# Altium footprint library ADNB95C.PcbLib: 249 footprints (part 15 of 16)
Each footprint in its own frame and in the unit in brackets; x right, y up, seen from the top. Pads: shape width x height; smd on the part's side, far side on the other; paste and mask are expansions set on the pad; w line width, h text height; cw(c..) or ccw(c..) is an arc to the next point about the centre after c.
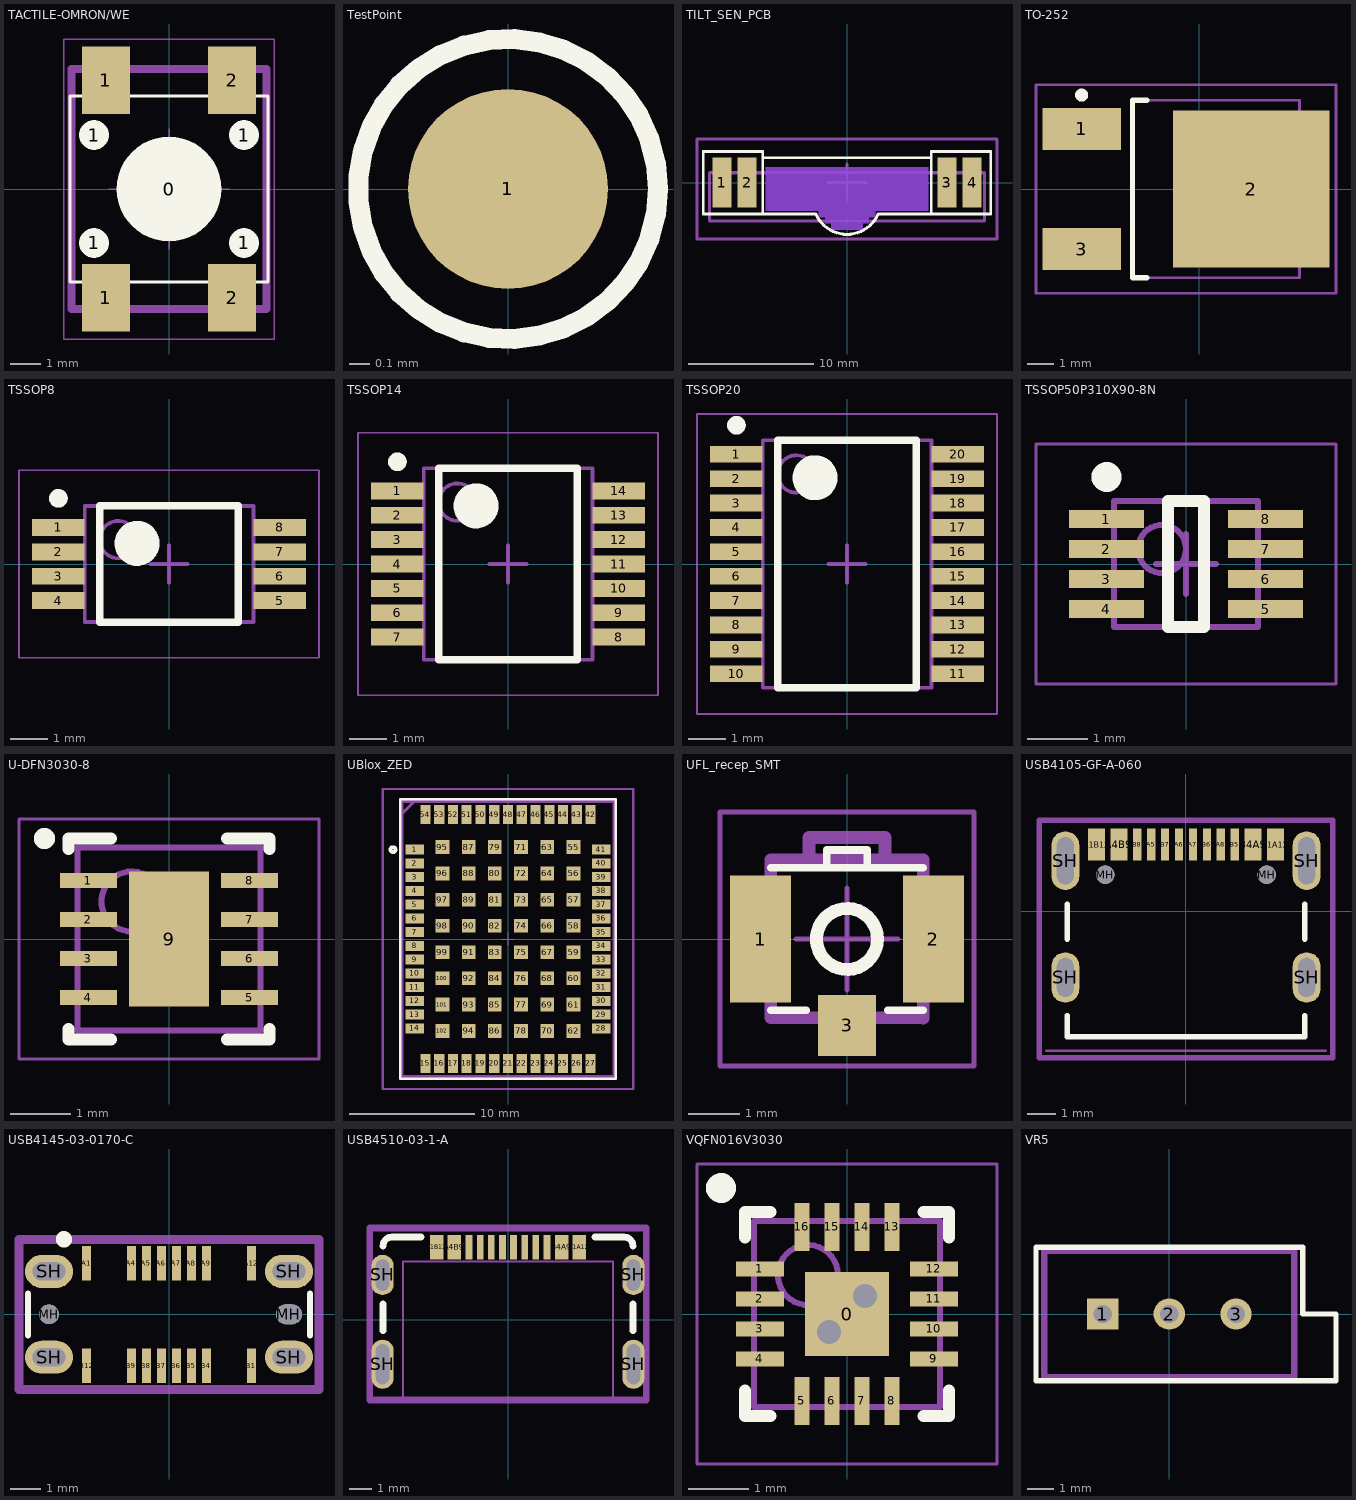
[diagram p14: the footprints below, top view; thin cyan lines are the x and y axes]

## TACTILE-OMRON/WE [mm] "TACTILE, 6 x 6mm-OMRON/Wurth Electronics"
height 4.3
pads (9):
  round 3.5 on Top Overlay: 0(0,0)
  round 1 on Top Overlay: 1(-2.5,-1.8) 1(-2.5,1.8) 1(2.5,-1.8) 1(2.5,1.8)
  rect 1.6x2.25 smd: 1(-2.1,-3.625) 1(-2.1,3.625) 2(2.1,-3.625) 2(2.1,3.625)
Top Overlay:
  lines w0.1: -3.3,-3.1 -3.3,3.1 3.3,3.1 3.3,-3.1 -3.3,-3.1
Top Designator (Mech7):
  text ".Designator" at -7.618,-0.508 h1.52
Top Assembly:
  lines w0.254: -3.25,-4 3.25,-4 3.25,4 -3.25,4 -3.25,-4
Top Courtyard:
  lines w0.05: -2,0 2,0 ; 0,-2 0,2 ; -3.5,-5 3.5,-5 3.5,5 -3.5,5 -3.5,-5
3D body "User Library-TS-1143S-WP.STEP": height 4.3, standoff 0, extent -3.25,-4 3.25,4

## TestPoint [mm]
height 2.5
pads (1):
  round 1 smd paste-10: 1(0,0)
Top Overlay:
  circle w0.1: c0,0 r0.75
Top Designator (Mech7):
  text ".Designator" at -3.809,-0.254 h0.76

## TILT_SEN_PCB [mm]
pads (4):
  rect 1.524x4 smd: 1(-10,0) 2(-8,0) 3(8,0) 4(10,0)
Top Layer keep-out:
  region: -6.5,1.25 6.5,1.25 6.5,-2.25 5.5,-2.25 2.25,-2.25 2.25,-2.75 1.75,-2.75 1.75,-3.25 1.25,-3.25 1.25,-3.75 -1.25,-3.75 -1.25,-3.25 -1.75,-3.25 -1.75,-2.75 -2.25,-2.75 -2.25,-2.25 -6.5,-2.25
Bottom Layer keep-out:
  region: 6.5,1.25 -6.5,1.25 -6.5,-2.25 -5.5,-2.25 -2.25,-2.25 -2.25,-2.75 -1.75,-2.75 -1.75,-3.25 -1.25,-3.25 -1.25,-3.75 1.25,-3.75 1.25,-3.25 1.75,-3.25 1.75,-2.75 2.25,-2.75 2.25,-2.25 5.5,-2.25 6.5,-2.25
Top Overlay:
  lines w0.203: -6.75,-2.5 -6.75,2.5 -11.5,2.5 -11.5,-2.5 -2.5,-2.5 ; -6.75,2 6.75,2 ; 2.5,-2.5 11.5,-2.5 11.5,2.5 6.75,2.5 6.75,-2.5
  lines w0.254: -2.5,-2.5 ccw(c0,-1.4) 2.5,-2.5
Keep-Out Layer:
  lines w0.254: -1.915,-1.977 ccw(c0,-1.4) 1.908,-2 5.5,-2 6.25,-1.5 6.25,1 -6.25,1 -6.25,-1.5 -5.5,-2 -1.908,-2
Top Designator (Mech7):
  text ".Designator" at -7.618,-0.508 h1.52
Top Assembly:
  lines w0.254: -11,-3.051 -11,0.8 11,0.8 11,-3.051 -11,-3.051
Top Courtyard:
  lines w0.254: -1.5,0 1.5,0 ; 0,-1.5 0,1.5 ; -12,-4.5 -12,3.5 12,3.5 12,-4.5 -12,-4.5
3D body "Tilt_Sensor.step": height 10.01, standoff -3.99, extent -11,-3.051 11,0.8

## TO-252 [mm] "D-PAK, 3-Pads, Body 6.4x6.8mm (max), IPC Medium Density"
height 2.3
pads (3):
  rect 3x1.6 smd: 1(-4.5,2.3) 3(-4.5,-2.3)
  rect 6x6 smd: 2(2,0)
Top Overlay:
  circle w0.25: c-4.5,3.6 r0.125
  lines w0.2: -2,-3.4 -2.55,-3.4 -2.55,3.4 -2,3.4
Top Designator (Mech7):
  text ".Designator" at -7.618,-0.508 h1.52
Top Assembly:
  lines w0.1: -2.55,-3.4 -2.55,3.4 3.85,3.4 3.85,-3.4 -2.55,-3.4
Top Courtyard:
  lines w0.1: -0.5,0 0.5,0 ; 0,-0.5 0,0.5 ; -6.25,-4 -6.25,4 5.25,4 5.25,-4 -6.25,-4
3D body "User Library-DPAK_TO-252AA.STEP": height 2.42, standoff 0.02, extent -5.528,-3.367 4.572,3.367

## TSSOP8 [mm] "TSSOP, 8-Leads, Body 3.00x4.40mm, Pitch 0.65mm, IPC Medium Density"
height 1.2
pads (8):
  rect 1.4x0.45 smd: 1(-2.95,0.975) 2(-2.95,0.325) 3(-2.95,-0.325) 4(-2.95,-0.975) 5(2.95,-0.975) 6(2.95,-0.325) 7(2.95,0.325) 8(2.95,0.975)
Top Overlay:
  circle w0.6: c-0.85,0.55 r0.3
  circle w0.25: c-2.95,1.75 r0.125
  lines w0.2: -1.85,-1.55 1.85,-1.55 1.85,1.55 -1.85,1.55 -1.85,-1.55
Top Designator (Mech7):
  text ".Designator" at -3.809,-0.166 h0.76
Top Assembly:
  circle w0.1: c-1.35,0.65 r0.5
  lines w0.1: -2.25,-1.55 2.25,-1.55 2.25,1.55 -2.25,1.55 -2.25,-1.55
Top Courtyard:
  lines w0.05: -4,-2.5 4,-2.5 4,2.5 -4,2.5 -4,-2.5
  lines w0.1: -0.5,0 0.5,0 ; 0,-0.5 0,0.5
3D body "TSSOP8.step": height 1.2, standoff 0, extent -3.2,-1.55 3.2,1.55

## TSSOP14 [mm]
height 1.2
pads (14):
  rect 1.4x0.45 smd: 1(-2.95,1.95) 2(-2.95,1.3) 3(-2.95,0.65) 4(-2.95,0) 5(-2.95,-0.65) 6(-2.95,-1.3) 7(-2.95,-1.95) 8(2.95,-1.95) 9(2.95,-1.3) 10(2.95,-0.65) 11(2.95,0) 12(2.95,0.65) 13(2.95,1.3) 14(2.95,1.95)
Top Overlay:
  circle w0.25: c-2.95,2.725 r0.125
  circle w0.6: c-0.85,1.55 r0.3
  lines w0.2: -1.85,-2.55 -1.85,2.55 1.85,2.55 1.85,-2.55 -1.85,-2.55
Top Designator (Mech7):
  text ".Designator" at -7.618,-0.433 h1.52
Top Assembly:
  circle w0.1: c-1.35,1.65 r0.5
  lines w0.1: -2.25,-2.55 -2.25,2.55 2.25,2.55 2.25,-2.55 -2.25,-2.55
Top Courtyard:
  lines w0.05: -4,-3.5 -4,3.5 4,3.5 4,-3.5 -4,-3.5
  lines w0.1: -0.5,0 0.5,0 ; 0,-0.5 0,0.5
3D body "TSSOP14.step": height 1.2, standoff 0, extent -3.2,-2.55 3.2,2.55

## TSSOP20 [mm]
height 1.2
pads (20):
  rect 1.4x0.45 smd: 1(-2.95,2.925) 2(-2.95,2.275) 3(-2.95,1.625) 4(-2.95,0.975) 5(-2.95,0.325) 6(-2.95,-0.325) 7(-2.95,-0.975) 8(-2.95,-1.625) 9(-2.95,-2.275) 10(-2.95,-2.925) 11(2.95,-2.925) 12(2.95,-2.275) 13(2.95,-1.625) 14(2.95,-0.975) 15(2.95,-0.325) 16(2.95,0.325) 17(2.95,0.975) 18(2.95,1.625) 19(2.95,2.275) 20(2.95,2.925)
Top Overlay:
  circle w0.6: c-0.85,2.3 r0.3
  circle w0.25: c-2.95,3.7 r0.125
  lines w0.2: -1.85,-3.3 1.85,-3.3 1.85,3.3 -1.85,3.3 -1.85,-3.3
Top Designator (Mech7):
  text ".Designator" at -7.618,-0.32 h1.52
Top Assembly:
  circle w0.1: c-1.35,2.4 r0.5
  lines w0.1: -2.25,-3.3 2.25,-3.3 2.25,3.3 -2.25,3.3 -2.25,-3.3
Top Courtyard:
  lines w0.05: -4,-4 4,-4 4,4 -4,4 -4,-4
  lines w0.1: -0.5,0 0.5,0 ; 0,-0.5 0,0.5
3D body "TSSOP20.step": height 1.2, standoff 0, extent -3.2,-3.3 3.2,3.3

## TSSOP50P310X90-8N [mm] "TSSOP, 8-Leads, Body 2.00x2.30mm, Pitch 0.50mm, IPC Medium Density"
height 0.9
pads (8):
  rect 1.25x0.3 smd: 1(-1.325,0.75) 2(-1.325,0.25) 3(-1.325,-0.25) 4(-1.325,-0.75) 5(1.325,-0.75) 6(1.325,-0.25) 7(1.325,0.25) 8(1.325,0.75)
Top Overlay:
  circle w0.25: c-1.325,1.45 r0.125
  lines w0.2: -0.3,-1.05 0.3,-1.05 0.3,1.05 -0.3,1.05 -0.3,-1.05
Top Designator (Mech7):
  text ".Designator" at -3.809,-0.066 h0.76
Top Assembly:
  circle w0.1: c-0.4,0.25 r0.4
  lines w0.1: -1.2,-1.05 1.2,-1.05 1.2,1.05 -1.2,1.05 -1.2,-1.05
Top Courtyard:
  lines w0.05: -2.5,-2 2.5,-2 2.5,2 -2.5,2 -2.5,-2
  lines w0.1: -0.5,0 0.5,0 ; 0,-0.5 0,0.5
3D body: height 0.9, standoff 0.1, extent -1.2,-1.05 1.2,1.05

## U-DFN3030-8 [mm] "SON, 8-Leads, Body 3.00x3.00mm, Pitch 0.65mm, Thermal Pad 2.25x1.34mm, IPC Medium Density"
height 0.63
pads (9):
  rect 0.95x0.25 smd: 1(-1.345,0.975) 2(-1.345,0.325) 3(-1.345,-0.325) 4(-1.345,-0.975) 5(1.345,-0.975) 6(1.345,-0.325) 7(1.345,0.325) 8(1.345,0.975)
  rect 1.34x2.25 smd: 9(0,0)
Top Overlay:
  circle w0.254: c-2.075,1.675 r0.05
  lines w0.2: -1.675,-1.5 -1.675,-1.675 -0.97,-1.675 ; -1.675,1.5 -1.675,1.675 -0.97,1.675 ; 0.97,-1.675 1.675,-1.675 1.675,-1.5 ; 0.97,1.675 1.675,1.675 1.675,1.5
Top Designator (Mech7):
  text ".Designator" at -6.165,-0.393 h1.22
Top Assembly:
  circle w0.1: c-0.625,0.625 r0.5
  lines w0.1: -1.525,-1.525 -1.525,1.525 1.525,1.525 1.525,-1.525 -1.525,-1.525
Top Courtyard:
  lines w0.05: -2.5,-2 -2.5,2 2.5,2 2.5,-2 -2.5,-2
  lines w0.1: -0.5,0 0.5,0 ; 0,-0.5 0,0.5
3D body "U-DFN3030-8.step": height 0.63, standoff 0, extent -1.625,-1.525 1.625,1.525

## UBlox_ZED [mm]
pads (102):
  rect 1.5x0.8 smd paste-1000 mask-1000: 1(-7.45,7.15) 2(-7.45,6.05) 3(-7.45,4.95) 4(-7.45,3.85) 5(-7.45,2.75) 6(-7.45,1.65) 7(-7.45,0.55) 8(-7.45,-0.55) 9(-7.45,-1.65) 10(-7.45,-2.75) 11(-7.45,-3.85) 12(-7.45,-4.95) 13(-7.45,-6.05) 14(-7.45,-7.15) 28(7.45,-7.15) 29(7.45,-6.05) 30(7.45,-4.95) 31(7.45,-3.85) 32(7.45,-2.75) 33(7.45,-1.65) 34(7.45,-0.55) 35(7.45,0.55) 36(7.45,1.65) 37(7.45,2.75) 38(7.45,3.85) 39(7.45,4.95) 40(7.45,6.05) 41(7.45,7.15)
  rect 0.8x1.5 smd paste-1000 mask-1000: 15(-6.6,-9.95) 16(-5.5,-9.95) 17(-4.4,-9.95) 18(-3.3,-9.95) 19(-2.2,-9.95) 20(-1.1,-9.95) 21(0,-9.95) 22(1.1,-9.95) 23(2.2,-9.95) 24(3.3,-9.95) 25(4.4,-9.95) 26(5.5,-9.95) 27(6.6,-9.95) 42(6.6,9.95) 43(5.5,9.95) 44(4.4,9.95) 45(3.3,9.95) 46(2.2,9.95) 47(1.1,9.95) 48(0,9.95) 49(-1.1,9.95) 50(-2.2,9.95) 51(-3.3,9.95) 52(-4.4,9.95) 53(-5.5,9.95) 54(-6.6,9.95)
  rect 1.1x1.1 smd paste-1000 mask+0: 55(5.25,7.35) 56(5.25,5.25) 57(5.25,3.15) 58(5.25,1.05) 59(5.25,-1.05) 60(5.25,-3.15) 61(5.25,-5.25) 62(5.25,-7.35) 63(3.15,7.35) 64(3.15,5.25) 65(3.15,3.15) 66(3.15,1.05) 67(3.15,-1.05) 68(3.15,-3.15) 69(3.15,-5.25) 70(3.15,-7.35) 71(1.05,7.35) 72(1.05,5.25) 73(1.05,3.15) 74(1.05,1.05) 75(1.05,-1.05) 76(1.05,-3.15) 77(1.05,-5.25) 78(1.05,-7.35) 79(-1.05,7.35) 80(-1.05,5.25) 81(-1.05,3.15) 82(-1.05,1.05) 83(-1.05,-1.05) 84(-1.05,-3.15) 85(-1.05,-5.25) 86(-1.05,-7.35) 87(-3.15,7.35) 88(-3.15,5.25) 89(-3.15,3.15) 90(-3.15,1.05) 91(-3.15,-1.05) 92(-3.15,-3.15) 93(-3.15,-5.25) 94(-3.15,-7.35) 95(-5.25,7.35) 96(-5.25,5.25) 97(-5.25,3.15) 98(-5.25,1.05) 99(-5.25,-1.05) 100(-5.25,-3.15) 101(-5.25,-5.25) 102(-5.25,-7.35)
Top Overlay:
  circle w0.3: c-9.2,7.15 r0.2
  lines w0.2: -8.6,-11.175 8.6,-11.175 8.6,11.175 -8.6,11.175 -8.6,-11.175
Top Paste:
  region: -5.775,-6.825 -5.775,-7.875 -4.725,-7.875 -4.725,-6.825
  region: -5.775,-4.725 -5.775,-5.775 -4.725,-5.775 -4.725,-4.725
  region: -5.775,-2.625 -5.775,-3.675 -4.725,-3.675 -4.725,-2.625
  region: -5.775,-0.525 -5.775,-1.575 -4.725,-1.575 -4.725,-0.525
  region: -5.775,1.575 -5.775,0.525 -4.725,0.525 -4.725,1.575
  region: -5.775,3.675 -5.775,2.625 -4.725,2.625 -4.725,3.675
  region: -5.775,5.775 -5.775,4.725 -4.725,4.725 -4.725,5.775
  region: -5.775,7.875 -5.775,6.825 -4.725,6.825 -4.725,7.875
  region: -3.675,-6.825 -3.675,-7.875 -2.625,-7.875 -2.625,-6.825
  region: -3.675,-4.725 -3.675,-5.775 -2.625,-5.775 -2.625,-4.725
  region: -3.675,-2.625 -3.675,-3.675 -2.625,-3.675 -2.625,-2.625
  region: -3.675,-0.525 -3.675,-1.575 -2.625,-1.575 -2.625,-0.525
  region: -3.675,1.575 -3.675,0.525 -2.625,0.525 -2.625,1.575
  region: -3.675,3.675 -3.675,2.625 -2.625,2.625 -2.625,3.675
  region: -3.675,5.775 -3.675,4.725 -2.625,4.725 -2.625,5.775
  region: -3.675,7.875 -3.675,6.825 -2.625,6.825 -2.625,7.875
  region: -1.575,-6.825 -1.575,-7.875 -0.525,-7.875 -0.525,-6.825
  region: -1.575,-4.725 -1.575,-5.775 -0.525,-5.775 -0.525,-4.725
  region: -1.575,-2.625 -1.575,-3.675 -0.525,-3.675 -0.525,-2.625
  region: -1.575,-0.525 -1.575,-1.575 -0.525,-1.575 -0.525,-0.525
  region: -1.575,1.575 -1.575,0.525 -0.525,0.525 -0.525,1.575
  region: -1.575,3.675 -1.575,2.625 -0.525,2.625 -0.525,3.675
  region: -1.575,5.775 -1.575,4.725 -0.525,4.725 -0.525,5.775
  region: -1.575,7.875 -1.575,6.825 -0.525,6.825 -0.525,7.875
  region: 0.525,-6.825 0.525,-7.875 1.575,-7.875 1.575,-6.825
  region: 0.525,-4.725 0.525,-5.775 1.575,-5.775 1.575,-4.725
  region: 0.525,-2.625 0.525,-3.675 1.575,-3.675 1.575,-2.625
  region: 0.525,-0.525 0.525,-1.575 1.575,-1.575 1.575,-0.525
  region: 0.525,1.575 0.525,0.525 1.575,0.525 1.575,1.575
  region: 0.525,3.675 0.525,2.625 1.575,2.625 1.575,3.675
  region: 0.525,5.775 0.525,4.725 1.575,4.725 1.575,5.775
  region: 0.525,7.875 0.525,6.825 1.575,6.825 1.575,7.875
  region: 2.625,-6.825 2.625,-7.875 3.675,-7.875 3.675,-6.825
  region: 2.625,-4.725 2.625,-5.775 3.675,-5.775 3.675,-4.725
  region: 2.625,-2.625 2.625,-3.675 3.675,-3.675 3.675,-2.625
  region: 2.625,-0.525 2.625,-1.575 3.675,-1.575 3.675,-0.525
  region: 2.625,1.575 2.625,0.525 3.675,0.525 3.675,1.575
  region: 2.625,3.675 2.625,2.625 3.675,2.625 3.675,3.675
  region: 2.625,5.775 2.625,4.725 3.675,4.725 3.675,5.775
  region: 2.625,7.875 2.625,6.825 3.675,6.825 3.675,7.875
  region: 4.725,-6.825 4.725,-7.875 5.775,-7.875 5.775,-6.825
  region: 4.725,-4.725 4.725,-5.775 5.775,-5.775 5.775,-4.725
  region: 4.725,-2.625 4.725,-3.675 5.775,-3.675 5.775,-2.625
  region: 4.725,-0.525 4.725,-1.575 5.775,-1.575 5.775,-0.525
  region: 4.725,1.575 4.725,0.525 5.775,0.525 5.775,1.575
  region: 4.725,3.675 4.725,2.625 5.775,2.625 5.775,3.675
  region: 4.725,5.775 4.725,4.725 5.775,4.725 5.775,5.775
  region: 4.725,7.875 4.725,6.825 5.775,6.825 5.775,7.875
  region: -6.975,10.725 -6.975,9.175 -6.225,9.175 -6.225,10.725
  region: -5.875,10.725 -5.875,9.175 -5.125,9.175 -5.125,10.725
  region: -4.775,10.725 -4.775,9.175 -4.025,9.175 -4.025,10.725
  region: -3.675,10.725 -3.675,9.175 -2.925,9.175 -2.925,10.725
  region: -2.575,10.725 -2.575,9.175 -1.825,9.175 -1.825,10.725
  region: -1.475,10.725 -1.475,9.175 -0.725,9.175 -0.725,10.725
  region: -0.375,10.725 -0.375,9.175 0.375,9.175 0.375,10.725
  region: 0.725,10.725 0.725,9.175 1.475,9.175 1.475,10.725
  region: 1.825,10.725 1.825,9.175 2.575,9.175 2.575,10.725
  region: 2.925,10.725 2.925,9.175 3.675,9.175 3.675,10.725
  region: 4.025,10.725 4.025,9.175 4.775,9.175 4.775,10.725
  region: 5.125,10.725 5.125,9.175 5.875,9.175 5.875,10.725
  region: 6.225,10.725 6.225,9.175 6.975,9.175 6.975,10.725
  region: 6.225,-9.175 6.225,-10.725 6.975,-10.725 6.975,-9.175
  region: 5.125,-9.175 5.125,-10.725 5.875,-10.725 5.875,-9.175
  region: 4.025,-9.175 4.025,-10.725 4.775,-10.725 4.775,-9.175
  region: 2.925,-9.175 2.925,-10.725 3.675,-10.725 3.675,-9.175
  region: 1.825,-9.175 1.825,-10.725 2.575,-10.725 2.575,-9.175
  region: 0.725,-9.175 0.725,-10.725 1.475,-10.725 1.475,-9.175
  region: -0.375,-9.175 -0.375,-10.725 0.375,-10.725 0.375,-9.175
  region: -1.475,-9.175 -1.475,-10.725 -0.725,-10.725 -0.725,-9.175
  region: -2.575,-9.175 -2.575,-10.725 -1.825,-10.725 -1.825,-9.175
  region: -3.675,-9.175 -3.675,-10.725 -2.925,-10.725 -2.925,-9.175
  region: -4.775,-9.175 -4.775,-10.725 -4.025,-10.725 -4.025,-9.175
  region: -5.875,-9.175 -5.875,-10.725 -5.125,-10.725 -5.125,-9.175
  region: -6.975,-9.175 -6.975,-10.725 -6.225,-10.725 -6.225,-9.175
  region: 6.675,7.525 6.675,6.775 8.225,6.775 8.225,7.525
  region: 6.675,6.425 6.675,5.675 8.225,5.675 8.225,6.425
  region: 6.675,5.325 6.675,4.575 8.225,4.575 8.225,5.325
  region: 6.675,4.225 6.675,3.475 8.225,3.475 8.225,4.225
  region: 6.675,3.125 6.675,2.375 8.225,2.375 8.225,3.125
  region: 6.675,2.025 6.675,1.275 8.225,1.275 8.225,2.025
  region: 6.675,0.925 6.675,0.175 8.225,0.175 8.225,0.925
  region: 6.675,-0.175 6.675,-0.925 8.225,-0.925 8.225,-0.175
  region: 6.675,-1.275 6.675,-2.025 8.225,-2.025 8.225,-1.275
  region: 6.675,-2.375 6.675,-3.125 8.225,-3.125 8.225,-2.375
  region: 6.675,-3.475 6.675,-4.225 8.225,-4.225 8.225,-3.475
  region: 6.675,-4.575 6.675,-5.325 8.225,-5.325 8.225,-4.575
  region: 6.675,-5.675 6.675,-6.425 8.225,-6.425 8.225,-5.675
  region: 6.675,-6.775 6.675,-7.525 8.225,-7.525 8.225,-6.775
  region: -8.225,-6.775 -8.225,-7.525 -6.675,-7.525 -6.675,-6.775
  region: -8.225,-5.675 -8.225,-6.425 -6.675,-6.425 -6.675,-5.675
  region: -8.225,-4.575 -8.225,-5.325 -6.675,-5.325 -6.675,-4.575
  region: -8.225,-3.475 -8.225,-4.225 -6.675,-4.225 -6.675,-3.475
  region: -8.225,-2.375 -8.225,-3.125 -6.675,-3.125 -6.675,-2.375
  region: -8.225,-1.275 -8.225,-2.025 -6.675,-2.025 -6.675,-1.275
  region: -8.225,-0.175 -8.225,-0.925 -6.675,-0.925 -6.675,-0.175
  region: -8.225,0.925 -8.225,0.175 -6.675,0.175 -6.675,0.925
  region: -8.225,2.025 -8.225,1.275 -6.675,1.275 -6.675,2.025
  region: -8.225,3.125 -8.225,2.375 -6.675,2.375 -6.675,3.125
  region: -8.225,4.225 -8.225,3.475 -6.675,3.475 -6.675,4.225
  region: -8.225,5.325 -8.225,4.575 -6.675,4.575 -6.675,5.325
  region: -8.225,6.425 -8.225,5.675 -6.675,5.675 -6.675,6.425
  region: -8.225,7.525 -8.225,6.775 -6.675,6.775 -6.675,7.525
Top Solder:
  region: -7,10.725 -7,9.175 -6.2,9.175 -6.2,10.725
  region: -5.9,10.725 -5.9,9.175 -5.1,9.175 -5.1,10.725
  region: -4.8,10.725 -4.8,9.175 -4,9.175 -4,10.725
  region: -3.7,10.725 -3.7,9.175 -2.9,9.175 -2.9,10.725
  region: -2.6,10.725 -2.6,9.175 -1.8,9.175 -1.8,10.725
  region: -1.5,10.725 -1.5,9.175 -0.7,9.175 -0.7,10.725
  region: -0.4,10.725 -0.4,9.175 0.4,9.175 0.4,10.725
  region: 0.7,10.725 0.7,9.175 1.5,9.175 1.5,10.725
  region: 1.8,10.725 1.8,9.175 2.6,9.175 2.6,10.725
  region: 2.9,10.725 2.9,9.175 3.7,9.175 3.7,10.725
  region: 4,10.725 4,9.175 4.8,9.175 4.8,10.725
  region: 5.1,10.725 5.1,9.175 5.9,9.175 5.9,10.725
  region: 6.2,10.725 6.2,9.175 7,9.175 7,10.725
  region: 6.2,-9.175 6.2,-10.725 7,-10.725 7,-9.175
  region: 5.1,-9.175 5.1,-10.725 5.9,-10.725 5.9,-9.175
  region: 4,-9.175 4,-10.725 4.8,-10.725 4.8,-9.175
  region: 2.9,-9.175 2.9,-10.725 3.7,-10.725 3.7,-9.175
  region: 1.8,-9.175 1.8,-10.725 2.6,-10.725 2.6,-9.175
  region: 0.7,-9.175 0.7,-10.725 1.5,-10.725 1.5,-9.175
  region: -0.4,-9.175 -0.4,-10.725 0.4,-10.725 0.4,-9.175
  region: -1.5,-9.175 -1.5,-10.725 -0.7,-10.725 -0.7,-9.175
  region: -2.6,-9.175 -2.6,-10.725 -1.8,-10.725 -1.8,-9.175
  region: -3.7,-9.175 -3.7,-10.725 -2.9,-10.725 -2.9,-9.175
  region: -4.8,-9.175 -4.8,-10.725 -4,-10.725 -4,-9.175
  region: -5.9,-9.175 -5.9,-10.725 -5.1,-10.725 -5.1,-9.175
  region: -7,-9.175 -7,-10.725 -6.2,-10.725 -6.2,-9.175
  region: 6.675,7.55 6.675,6.75 8.225,6.75 8.225,7.55
  region: 6.675,6.45 6.675,5.65 8.225,5.65 8.225,6.45
  region: 6.675,5.35 6.675,4.55 8.225,4.55 8.225,5.35
  region: 6.675,4.25 6.675,3.45 8.225,3.45 8.225,4.25
  region: 6.675,3.15 6.675,2.35 8.225,2.35 8.225,3.15
  region: 6.675,2.05 6.675,1.25 8.225,1.25 8.225,2.05
  region: 6.675,0.95 6.675,0.15 8.225,0.15 8.225,0.95
  region: 6.675,-0.15 6.675,-0.95 8.225,-0.95 8.225,-0.15
  region: 6.675,-1.25 6.675,-2.05 8.225,-2.05 8.225,-1.25
  region: 6.675,-2.35 6.675,-3.15 8.225,-3.15 8.225,-2.35
  region: 6.675,-3.45 6.675,-4.25 8.225,-4.25 8.225,-3.45
  region: 6.675,-4.55 6.675,-5.35 8.225,-5.35 8.225,-4.55
  region: 6.675,-5.65 6.675,-6.45 8.225,-6.45 8.225,-5.65
  region: 6.675,-6.75 6.675,-7.55 8.225,-7.55 8.225,-6.75
  region: -8.225,-6.75 -8.225,-7.55 -6.675,-7.55 -6.675,-6.75
  region: -8.225,-5.65 -8.225,-6.45 -6.675,-6.45 -6.675,-5.65
  region: -8.225,-4.55 -8.225,-5.35 -6.675,-5.35 -6.675,-4.55
  region: -8.225,-3.45 -8.225,-4.25 -6.675,-4.25 -6.675,-3.45
  region: -8.225,-2.35 -8.225,-3.15 -6.675,-3.15 -6.675,-2.35
  region: -8.225,-1.25 -8.225,-2.05 -6.675,-2.05 -6.675,-1.25
  region: -8.225,-0.15 -8.225,-0.95 -6.675,-0.95 -6.675,-0.15
  region: -8.225,0.95 -8.225,0.15 -6.675,0.15 -6.675,0.95
  region: -8.225,2.05 -8.225,1.25 -6.675,1.25 -6.675,2.05
  region: -8.225,3.15 -8.225,2.35 -6.675,2.35 -6.675,3.15
  region: -8.225,4.25 -8.225,3.45 -6.675,3.45 -6.675,4.25
  region: -8.225,5.35 -8.225,4.55 -6.675,4.55 -6.675,5.35
  region: -8.225,6.45 -8.225,5.65 -6.675,5.65 -6.675,6.45
  region: -8.225,7.55 -8.225,6.75 -6.675,6.75 -6.675,7.55
Top Designator (Mech7):
  text ".Designator" at -7.618,-0.508 h1.52
Top Assembly:
  lines w0.254: -8.5,-11 8.5,-11 8.5,11 -8.5,11 -8.5,-11 ; -8.5,10 -7.5,11
Top Courtyard:
  lines w0.1: -0.5,0 0.5,0 ; 0,-0.5 0,0.5
  lines w0.2: -10,-12 -10,12 10,12 10,-12 -10,-12
3D body "UNK_U-Blox_ZED-F9P-01B_eec.STEP": height 2.6, standoff 0, extent -8.5,-11 8.5,11

## UFL_recep_SMT [mm]
height 1.25
pads (3):
  rect 1.2x2.5 smd: 1(-1.7,0) 2(1.7,0)
  rect 1.15x1.2 smd: 3(0,-1.7)
Top Overlay:
  circle w0.254: c0,0 r0.6
  lines w0.15: -1.5,-1.4 -0.8,-1.4 ; -1.5,1.4 1.5,1.4 ; -0.4,1.4 -0.4,1.75 0.4,1.75 0.4,1.4 ; 0.8,-1.4 1.5,-1.4
Top Designator (Mech7):
  text ".Designator" at -7.618,-0.508 h1.52
Top Assembly:
  lines w0.254: -0.75,1.55 -0.75,2 0.75,2 0.75,1.55 ; 1.5,-1.55 -1.5,-1.55 -1.5,1.55 1.5,1.55 1.5,-1.55 ; 1.5,-1.55 1.5,-1.55
Top Courtyard:
  lines w0.1: -1,0 1,0 ; 0,-1 0,1 ; -2.5,-2.5 -2.5,2.5 2.5,2.5 2.5,-2.5 -2.5,-2.5
3D body "u.Fl Antenna Connector - 523-A-1JB.SLDPRT": height 1.26, standoff 0.01, extent -1.5,-1.55 1.5,1.55

## USB4105-GF-A-060 [mm]
pads (18):
  rect 0.6x1.15 smd mask+0.05: A1B12(-3.2,2.378) A4B9(-2.4,2.378) B1A12(3.2,2.378) B4A9(2.4,2.378)
  rect 0.3x1.15 smd mask+0.05: A5(-1.25,2.378) A6(-0.25,2.378) A7(0.25,2.378) A8(1.25,2.378) B5(1.75,2.378) B6(0.75,2.378) B7(-0.75,2.378) B8(-1.75,2.378)
  round 0.65 hole 0.65 unplated mask+0.05: MH(-2.89,1.303) MH(2.89,1.303)
  oval 1x1.8 hole 0.6 slot 1.4 at 90 deg: SH(-4.32,-2.377) SH(4.32,-2.377)
  oval 1x2.1 hole 0.6 slot 1.7 at 90 deg: SH(-4.32,1.803) SH(4.32,1.803)
Top Overlay:
  lines w0.2: -4.25,-3.75 -4.25,-4.5 4.25,-4.5 4.25,-3.75 ; -4.25,-1 -4.25,0.25 ; 4.25,-1 4.25,0.25
Mechanical 1:
  lines w0.1: -5,-5 5,-5
  text "PCB EDGE" at -1.016,-4.975 h0.25
Top Designator (Mech7):
  text "'.Designator'" at -5.84,-0.925 h1
Top Courtyard:
  lines w0.2: -5.25,-5.25 -5.25,-3 -5.25,3.25 5.25,3.25 5.25,-5.25 -5.25,-5.25
3D body "USB4105-GF-A-060.stp": height 3.27, standoff -0.61, extent -4.47,-4.972 4.47,2.728

## USB4145-03-0170-C [mm]
pads (22):
  rect 0.3x1.15 smd: A1(-2.75,1.71) A4(-1.25,1.71) A5(-0.75,1.71) A6(-0.25,1.71) A7(0.25,1.71) A8(0.75,1.71) A9(1.25,1.71) A12(2.75,1.71) B1(2.75,-1.71) B4(1.25,-1.71) B5(0.75,-1.71) B6(0.25,-1.71) B7(-0.25,-1.71) B8(-0.75,-1.71) B9(-1.25,-1.71) B12(-2.75,-1.71)
  round 0.66 hole 0.66 unplated: MH(-4,0)
  oval 0.86x0.66 hole 0.66 slot 0.86 at 0 deg unplated: MH(4,0)
  oval 1.6x1.1 hole 0.6 slot 1.1 at 0 deg: SH(-4,-1.43) SH(-4,1.43) SH(4,-1.43) SH(4,1.43)
Top Overlay:
  circle w0.5: c-3.5,2.5 r0.022
  lines w0.2: -4.7,-0.7 -4.7,0.7 ; 4.7,-0.7 4.7,0.7
Top Designator (Mech7):
  text "'.Designator'" at -5.815,-0.9 h1
Top Courtyard:
  lines w0.3: -5,-2.5 -5,2.5 5,2.5 5,-2.5 -5,-2.5
3D body "USB4145-03-0170-C.stp": height 7.47, standoff -1.69, extent -4.47,-1.855 4.475,1.835

## USB4510-03-1-A [mm]
pads (16):
  rect 0.6x1.1 smd: A1B12(-3.2,3.25) A4B9(-2.4,3.25) B1A12(3.2,3.25) B4A9(2.4,3.25)
  rect 0.3x1.1 smd: A5(-1.25,3.25) A6(-0.25,3.25) A7(0.25,3.25) A8(1.25,3.25) B5(1.75,3.25) B6(0.75,3.25) B7(-0.75,3.25) B8(-1.75,3.25)
  oval 1x2.2 hole 0.6 slot 1.8 at 90 deg: SH(-5.62,-2) SH(5.62,-2)
  oval 1x1.8 hole 0.6 slot 1.4 at 90 deg: SH(-5.62,2) SH(5.62,2)
Top Overlay:
  lines w0.3: -5.6,-0.5 -5.6,0.7 ; -5.6,3.3 cw(c-5.2,3.3) -5.2,3.7 -3.9,3.7 ; 3.9,3.7 5.2,3.7 cw(c5.2,3.3) 5.6,3.3 ; 5.6,-0.5 5.6,0.7
Mechanical 1:
  lines w0.1: -6,-3.6 -4.7,-3.6 -4.7,2.6 4.7,2.6 4.7,-3.6 6,-3.6
  text "PCB EDGE" at -1.016,-3.375 h0.25
Top Designator (Mech7):
  text "'.Designator'" at -5.815,-0.9 h1
Top Courtyard:
  lines w0.3: -6.2,-3.6 6.2,-3.6 6.2,4.1 -6.2,4.1 -6.2,-3.6
3D body "USB4510-03-1-A.stp": height 1.57, standoff -1.61, extent -5.77,-4.1 5.77,3.1

## VQFN016V3030 [mm] "QFN, 16-Leads, Body 3.00x3.00mm, Pitch 0.50mm, Thermal Pad 1.40x1.40mm, IPC Medium Density"
height 1
pads (17):
  rect 1.4x1.4 smd: 0(0,0)
  rect 0.8x0.25 smd: 1(-1.45,0.75) 2(-1.45,0.25) 3(-1.45,-0.25) 4(-1.45,-0.75) 9(1.45,-0.75) 10(1.45,-0.25) 11(1.45,0.25) 12(1.45,0.75)
  rect 0.25x0.8 smd: 5(-0.75,-1.45) 6(-0.25,-1.45) 7(0.25,-1.45) 8(0.75,-1.45) 13(0.75,1.45) 14(0.25,1.45) 15(-0.25,1.45) 16(-0.75,1.45)
via -0.3,-0.3 diameter 0.8 hole 0.4
via 0.3,0.3 diameter 0.8 hole 0.4
Top Overlay:
  circle w0.25: c-2.1,2.1 r0.125
  lines w0.2: -1.7,-1.275 -1.7,-1.7 -1.275,-1.7 ; -1.7,1.275 -1.7,1.7 -1.275,1.7 ; 1.275,-1.7 1.7,-1.7 1.7,-1.275 ; 1.275,1.7 1.7,1.7 1.7,1.275
Top Designator (Mech7):
  text ".Designator" at -3.809,-0.254 h0.76
Top Assembly:
  circle w0.1: c-0.65,0.65 r0.5
  lines w0.1: -1.55,-1.55 1.55,-1.55 1.55,1.55 -1.55,1.55 -1.55,-1.55
Top Courtyard:
  lines w0.05: -2.5,-2.5 2.5,-2.5 2.5,2.5 -2.5,2.5 -2.5,-2.5
  lines w0.1: -0.5,0 0.5,0 ; 0,-0.5 0,0.5
3D body "VQFN016V3030.step": height 1, standoff 0, extent -1.63,-1.63 1.63,1.63

## VR5 [mm] "Thru-Hole; 3 Leads"
height 18
pads (3):
  rect 1.2x1.2 hole 0.7: 1(-2.54,0)
  round 1.2 hole 0.7: 2(0,0) 3(2.54,0)
Top Overlay:
  lines w0.2: -5.08,-2.54 6.35,-2.54 6.35,0 5.08,0 5.08,2.54 -5.08,2.54 -5.08,-2.54
Top Designator (Mech7):
  text ".Designator" at -6.983,-0.508 h1.52
Top Assembly:
  lines w0.254: -4.765,-2.415 -4.765,2.415 4.765,2.415 4.765,-2.415 -4.765,-2.415
3D body "User Library-3296_Bourns.STEP": height 11.56, standoff -7.61, extent -4.765,-2.415 4.765,2.415